# Altium schematic symbol library SCHLIB.SchLib: 2608 symbols (part 7 of 20)
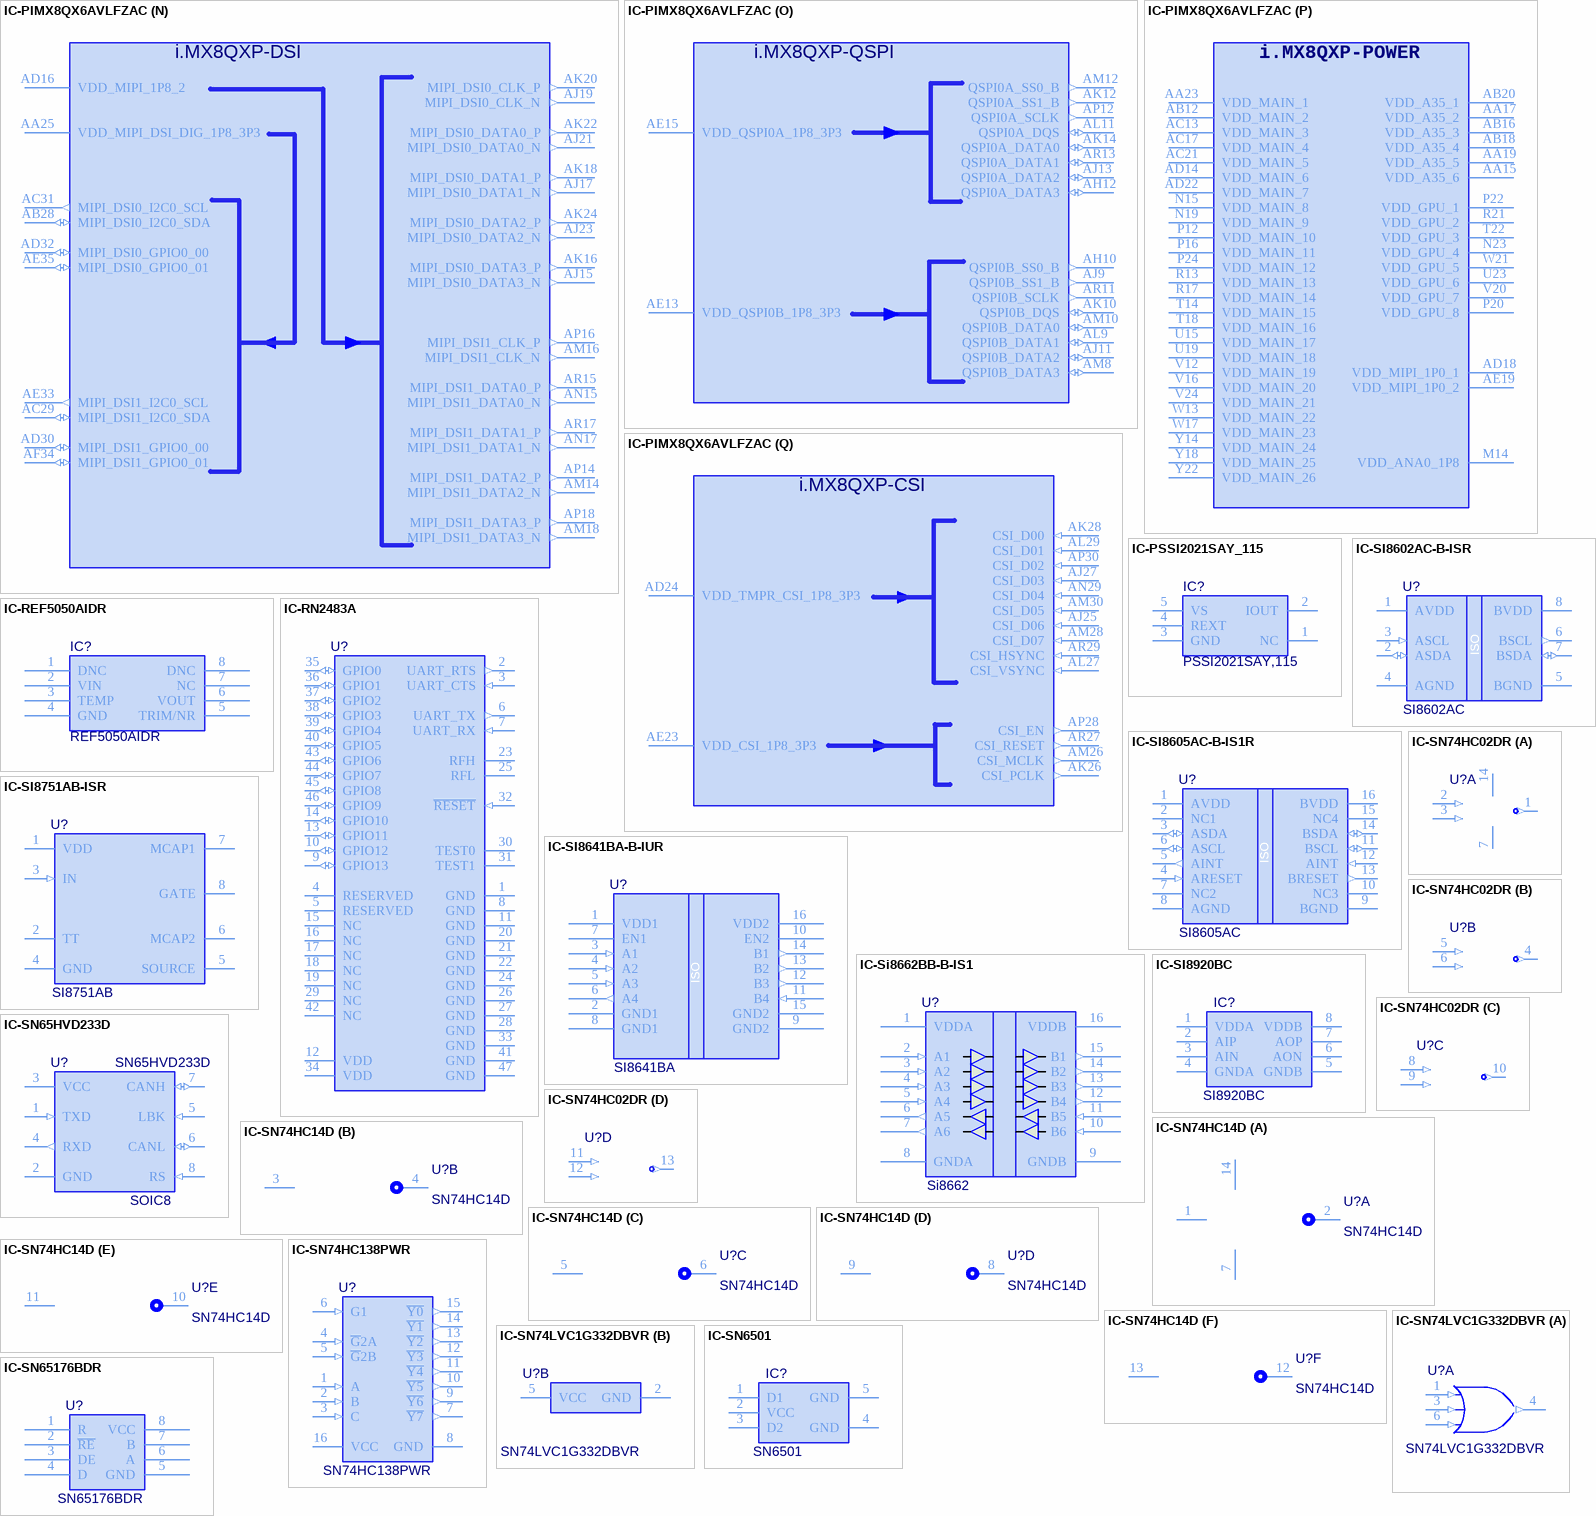
[diagram p89: symbols IC-PIMX8QX6AVLFZAC to IC-SN65176BDR]

## IC-PIMX8QX6AVLFZAC
designator U?, comment PIMX8QX6AVLFZAC  (value not drawn)
IC CPU QUAD CORTEX A35 M4 266MHZ 1.2GHZ 0.3-1.2V FCPBGA609; Manufacturer Part Number: PIMX8QX6AVLFZAC
footprint FBGA609 (0.8 mm pitch, 21 mm x 21 mm x 2.37 mm)
part A pins: A3 VSS_MAIN_1 (power), A17 VSS_MAIN_2 (power), A33 VSS_MAIN_3 (power), AA1 VSS_MAIN_4 (power), AA3 VSS_MAIN_5 (power), AA5 VSS_MAIN_6 (power), AA7 VSS_MAIN_7 (power), AA13 VSS_MAIN_8 (power), AA21 VSS_MAIN_10 (power), AA27 VSS_MAIN_11 (power), AB10 VSS_MAIN_12 (power), AB14 VSS_MAIN_13 (power), AB22 VSS_MAIN_14 (power), AB26 VSS_MAIN_15 (power), AB30 VSS_MAIN_16 (power), AC15 VSS_MAIN_17 (power), AC19 VSS_MAIN_18 (power), AC23 VSS_MAIN_19 (power), AC27 VSS_MAIN_20 (power), AC33 VSS_MAIN_21 (power), AD2 VSS_MAIN_22 (power), AD4 VSS_MAIN_23 (power), AD6 VSS_MAIN_24 (power), AD10 VSS_MAIN_25 (power), AD20 VSS_MAIN_26 (power), AD26 VSS_MAIN_27 (power), AE9 VSS_MAIN_28 (power), AE27 VSS_MAIN_29 (power), AF10 VSS_MAIN_30 (power), AF12 VSS_MAIN_31 (power), AF14 VSS_MAIN_32 (power), AF16 VSS_MAIN_33 (power), AF18 VSS_MAIN_34 (power), AF20 VSS_MAIN_35 (power), AF22 VSS_MAIN_36 (power), AF24 VSS_MAIN_37 (power), AF26 VSS_MAIN_38 (power), AF30 VSS_MAIN_39 (power), AG1 VSS_MAIN_40 (power), AG3 VSS_MAIN_41 (power), AG5 VSS_MAIN_42 (power), AG7 VSS_MAIN_43 (power), AG9 VSS_MAIN_44 (power), AG11 VSS_MAIN_45 (power), AG13 VSS_MAIN_46 (power), AG15 VSS_MAIN_47 (power), AG17 VSS_MAIN_48 (power), AG19 VSS_MAIN_49 (power), AG21 VSS_MAIN_50 (power), AG23 VSS_MAIN_51 (power), AG25 VSS_MAIN_52 (power), AG27 VSS_MAIN_53 (power), AG33 VSS_MAIN_54 (power), AH14 VSS_MAIN_55 (power), AH16 VSS_MAIN_56 (power), AH18 VSS_MAIN_57 (power), AH20 VSS_MAIN_58 (power), AH22 VSS_MAIN_59 (power), AH24 VSS_MAIN_60 (power), AH26 VSS_MAIN_61 (power), AK2 VSS_MAIN_62 (power), AK4 VSS_MAIN_63 (power), AK6 VSS_MAIN_64 (power), AK8 VSS_MAIN_65 (power), AK30 VSS_MAIN_66 (power), AL13 VSS_MAIN_67 (power), AL15 VSS_MAIN_68 (power), AL17 VSS_MAIN_69 (power), AL19 VSS_MAIN_70 (power), AL21 VSS_MAIN_71 (power), AL23 VSS_MAIN_72 (power), AL25 VSS_MAIN_73 (power), AL33 VSS_MAIN_74 (power), AN1 VSS_MAIN_75 (power), AN3 VSS_MAIN_76 (power), AN5 VSS_MAIN_77 (power), AN7 VSS_MAIN_78 (power), AN9 VSS_MAIN_79 (power), AN11 VSS_MAIN_80 (power), AN13 VSS_MAIN_81 (power), AN27 VSS_MAIN_82 (power), AN31 VSS_MAIN_83 (power), AN33 VSS_SCU_XTAL_2 (power), AN35 VSS_SCU_XTAL_3 (power), AR3 VSS_MAIN_100 (power), AR33 VSS_SCU_XTAL_1 (power), B8 VSS_MAIN_101 (power), B14 VSS_MAIN_102 (power), B20 VSS_MAIN_103 (power), C1 VSS_MAIN_104 (power), C3 VSS_MAIN_105 (power), C5 VSS_MAIN_106 (power), C7 VSS_MAIN_107 (power), C9 VSS_MAIN_108 (power), C11 VSS_MAIN_109 (power), C13 VSS_MAIN_110 (power), C17 VSS_MAIN_111 (power), C19 VSS_MAIN_112 (power), C23 VSS_MAIN_113 (power), C27 VSS_MAIN_114 (power), C31 VSS_MAIN_115 (power), C35 VSS_MAIN_116 (power), E15 VSS_MAIN_117 (power), E29 VSS_MAIN_118 (power), E33 VSS_MAIN_119 (power), F2 VSS_MAIN_120 (power), F4 VSS_MAIN_121 (power), F6 VSS_MAIN_122 (power), F8 VSS_MAIN_123 (power), F10 VSS_MAIN_124 (power), F18 VSS_MAIN_125 (power), F20 VSS_MAIN_126 (power), F24 VSS_MAIN_127 (power), H30 VSS_MAIN_128 (power), J1 VSS_MAIN_129 (power), J3 VSS_MAIN_130 (power), J5 VSS_MAIN_131 (power), J7 VSS_MAIN_132 (power), J9 VSS_MAIN_133 (power), J11 VSS_MAIN_134 (power), J13 VSS_MAIN_135 (power), J15 VSS_MAIN_136 (power), J17 VSS_MAIN_137 (power), J19 VSS_MAIN_138 (power), J21 VSS_MAIN_139 (power), J23 VSS_MAIN_140 (power), J25 VSS_MAIN_141 (power), J27 VSS_MAIN_142 (power), J33 VSS_MAIN_143 (power), K10 VSS_MAIN_144 (power), K12 VSS_MAIN_145 (power), K14 VSS_MAIN_146 (power), K16 VSS_MAIN_147 (power), K18 VSS_MAIN_148 (power), K20 VSS_MAIN_149 (power), K22 VSS_MAIN_150 (power), K24 VSS_MAIN_151 (power), K26 VSS_MAIN_152 (power), L9 VSS_MAIN_153 (power), L27 VSS_MAIN_154 (power), M2 VSS_MAIN_155 (power), M4 VSS_MAIN_156 (power), M6 VSS_MAIN_157 (power), M8 VSS_MAIN_158 (power), M10 VSS_MAIN_159 (power), M26 VSS_MAIN_160 (power), M30 VSS_MAIN_161 (power), N13 VSS_MAIN_162 (power), N17 VSS_MAIN_163 (power), N21 VSS_MAIN_164 (power), N27 VSS_MAIN_165 (power), N33 VSS_MAIN_166 (power), P10 VSS_MAIN_167 (power), P14 VSS_MAIN_168 (power), P18 VSS_MAIN_169 (power), P26 VSS_MAIN_170 (power), R1 VSS_MAIN_171 (power), R3 VSS_MAIN_172 (power), R5 VSS_MAIN_173 (power), R9 VSS_MAIN_174 (power), R15 VSS_MAIN_175 (power), R19 VSS_MAIN_176 (power), R23 VSS_MAIN_177 (power), R27 VSS_MAIN_178 (power), T10 VSS_MAIN_179 (power), T16 VSS_MAIN_180 (power), T20 VSS_MAIN_181 (power), T24 VSS_MAIN_182 (power), T26 VSS_MAIN_84 (power), T28 VSS_MAIN_85 (power), T30 VSS_MAIN_86 (power), T32 VSS_MAIN_87 (power), T34 VSS_MAIN_88 (power), U9 VSS_MAIN_89 (power), U13 VSS_MAIN_90 (power), U17 VSS_MAIN_91 (power), U21 VSS_MAIN_92 (power), U27 VSS_MAIN_93 (power), V2 VSS_MAIN_94 (power), V4 VSS_MAIN_95 (power), V6 VSS_MAIN_96 (power), V8 VSS_MAIN_97 (power), V10 VSS_MAIN_98 (power), V14 VSS_MAIN_99 (power), V18 VSS_MAIN_9 (power), V22 VSS_MAIN_198 (power), V26 VSS_MAIN_197 (power), W9 VSS_MAIN_196 (power), W15 VSS_MAIN_195 (power), W19 VSS_MAIN_194 (power), W23 VSS_MAIN_193 (power), W27 VSS_MAIN_192 (power), W31 VSS_MAIN_191 (power), W33 VSS_MAIN_190 (power), W35 VSS_MAIN_189 (power), Y10 VSS_MAIN_188 (power), Y16 VSS_MAIN_187 (power), Y20 VSS_MAIN_186 (power), Y26 VSS_MAIN_185 (power), Y28 VSS_MAIN_184 (power), Y30 VSS_MAIN_183 (power)
part B pins: A5 DDR_DQ31 (io), A7 DDR_DQ28 (io), AA9 VDD_DDR_VDDQ12 (power), AA11 VDD_DDR_VDDQ1 (power), AB2 DDR_DQ14 (io), AB4 DDR_DCF08 (out), AB6 DDR_DCF09 (out), AB8 DDR_ATO (out), AC1 DDR_DQ15 (io), AC3 DDR_DQ12 (io), AC5 DDR_DCF10 (out), AC7 DDR_DTO0 (out), AC9 VDD_DDR_PLL_1P8 (power), AC11 VDD_DDR_VDDQ2 (power), AD8 DDR_VREF (in), AD12 VDD_DDR_VDDQ3 (power), AE1 DDR_DQS1_N (io), AE3 DDR_DQ13 (io), AE5 DDR_DQ01 (io), AE7 DDR_DTO1 (out), AE11 VDD_DDR_VDDQ4 (power), AF2 DDR_DQS1_P (io), AF4 DDR_DM1 (out), AF6 DDR_DQ00 (io), AF8 DDR_DQ03 (io), AH2 DDR_DQ10 (io), AH4 DDR_DQ11 (io), AH6 DDR_DQS0_N (io), AH8 DDR_DQ02 (io), AJ1 DDR_DQ08 (io), AJ3 DDR_DQ09 (io), AJ5 DDR_DQS0_P (io), AJ7 DDR_DM0 (out), AL1 DDR_DQ32 (io), AL3 DDR_DQ34 (io), AL5 DDR_DQ06 (io), AL7 DDR_DQ07 (io), AM2 DDR_DQ33 (io), AM4 DDR_DQ04 (io), AM6 DDR_DQ05 (io), AP2 DDR_DQ35 (io), AP4 DDR_DQS4_P (io), AP6 DDR_DM4 (out), AP8 DDR_DQ36 (io), AP10 DDR_DQ37 (io), AR5 DDR_DQS4_N (io), AR7 DDR_DQ39 (io), AR9 DDR_DQ38 (io), B2 DDR_DQ30 (io), B4 DDR_DQ29 (io), B6 DDR_DQ16 (io), D2 DDR_DQS3_P (io), D4 DDR_DM2 (out), D6 DDR_DQS2_P (io), D8 DDR_DQ19 (io), E1 DDR_DM3 (out), E3 DDR_DQS3_N (io), E5 DDR_DQS2_N (io), E7 DDR_DQ18 (io), E9 DDR_DQ17 (io), G1 DDR_DQ27 (io), G3 DDR_DQ26 (io), G5 DDR_DQ23 (io), G7 DDR_DQ20 (io), G9 DDR_ZQ (in), H2 DDR_DQ24 (io), H4 DDR_DQ25 (io), H6 DDR_DQ22 (io), H8 DDR_DQ21 (io), K2 DDR_DCF29 (out), K4 DDR_DCF27 (out), K6 DDR_DCF28 (out), K8 DDR_DCF25 (out), L1 DDR_DCF18 (out), L3 DDR_DCF32 (out), L5 DDR_DCF31 (out), L7 DDR_DCF26 (out), M12 VDD_DDR_VDDQ5 (power), N1 DDR_DCF19 (out), N3 DDR_DCF17 (out), N5 DDR_CK1_N (out), N7 DDR_DCF30 (out), N9 VDD_DDR_VDDQ13 (power), N11 VDD_DDR_VDDQ6 (power), P2 DDR_DCF22 (out), P4 DDR_DCF20 (out), P6 DDR_CK1_P (out), P8 DDR_DCF33 (out), R7 VDD_DDR_VDDQ14 (power), R11 VDD_DDR_VDDQ7 (power), T2 DDR_DCF07 (out), T4 DDR_DCF23 (out), T6 DDR_DCF24 (out), T8 DDR_DCF21 (out), T12 VDD_DDR_VDDQ8 (power), U1 DDR_DCF03 (out), U3 DDR_DCF01 (out), U5 DDR_DCF05 (out), U7 DDR_DCF04 (out), U11 VDD_DDR_VDDQ9 (power), W1 DDR_DCF00 (out), W3 DDR_DCF11 (out), W5 DDR_CK0_P (out), W7 DDR_DCF16 (out), W11 VDD_DDR_VDDQ10 (power), Y2 DDR_DCF14 (out), Y4 DDR_DCF15 (out), Y6 DDR_CK0_N (out), Y8 DDR_DCF12 (out), Y12 VDD_DDR_VDDQ11 (power)
part C pins: A15 USB_SS3_TX_N (out), A19 USB_SS3_RX_P (in), B16 USB_SS3_TX_P (out), B18 USB_SS3_RX_N (in), C15 USB_SS3_TC3 (io), D14 USB_OTG2_REXT (io), D16 USB_OTG2_DN (io), D18 USB_OTG1_DP (io), E13 USB_SS3_REXT (io), E17 USB_OTG2_DP (io), E19 USB_OTG1_DN (io), F14 USB_SS3_TC0 (io), F16 USB_OTG2_ID (in), G15 USB_SS3_TC2 (io), G17 USB_OTG1_ID (in), H14 USB_SS3_TC1 (io), H16 USB_OTG2_VBUS (power), H18 USB_OTG1_VBUS (power), L15 VDD_USB_3P3 (power), L17 VDD_USB_OTG_1P0 (power), M16 VDD_USB_SS3_LDO_1P0_CAP (power), M18 VDD_USB_1P8 (power)
part D pins: A9 PCIE0_TX0_N (io), A11 PCIE_CTRL0_WAKE_B (in), A13 PCIE0_RX0_P (io), B10 PCIE0_TX0_P (io), B12 PCIE0_RX0_N (io), D10 PCIE_CTRL0_CLKREQ_B (out), D12 PCIE_REFCLK100M_N (io), E11 PCIE_REFCLK100M_P (io), F12 PCIE_REF_QR (out), G11 PCIE0_PHY_PLL_REF_RETURN (in), G13 VDD_PCIE_1P8 (power), H10 PCIE_CTRL0_PERST_B (out), H12 PCIE_REXT (io), L11 VDD_PCIE_DIG_1P8_3P3 (power), L13 VDD_PCIE_LDO_1P0_CAP (power)
part E pins: A25 USDHC1_VSELECT (out), A27 USDHC1_DATA0 (io), B24 USDHC1_RESET_B (out), B26 USDHC1_DATA1 (io), C25 USDHC1_CMD (out), D24 USDHC1_WP (out), D26 USDHC1_DATA2 (io), E23 USDHC1_CD_B (out), E25 USDHC1_DATA3 (io), G23 USDHC1_CLK (out), L21 VDD_USDHC1_VSELECT_1P8_3P3 (power), M22 VDD_USDHC1_1P8_3P3 (power)
part F pins: A21 EMMC0_DATA1 (io), A23 EMMC0_DATA6 (io), B22 EMMC0_DATA4 (io), C21 EMMC0_DATA0 (io), D20 EMMC0_CMD (out), D22 EMMC0_DATA7 (io), E21 EMMC0_DATA2 (io), F22 EMMC0_STROBE (out), G19 EMMC0_CLK (out), G21 EMMC0_DATA5 (io), H20 EMMC0_DATA3 (io), H22 EMMC0_RESET_B (out), L19 VDD_EMMC0_1P8_3P3 (power), M20 VDD_EMMC0_VSELECT_1P8_3P3 (power)
part G pins: A29 ENET0_RGMII_TX_CTL (out), A31 ENET0_RGMII_RXD0 (in), B28 ENET0_RGMII_TXD1 (out), B30 ENET0_RGMII_RX_CTL (out), B32 ENET0_MDIO (io), C29 ENET0_RGMII_RXD1 (in), D28 ENET0_RGMII_RXC (out), D30 ENET0_MDC (out), E27 ENET0_RGMII_TXD2 (out), F26 ENET0_RGMII_TXD3 (out), F28 ENET0_REFCLK_125M_25M (out), G25 ENET0_RGMII_TXD0 (out), G27 ENET0_RGMII_RXD2 (in), H24 ENET0_RGMII_TXC (out), H26 ENET0_RGMII_RXD3 (in), L23 VDD_ENET0_VSELECT_1P8_2P5_3P3 (power), L25 VDD_ENET_MDIO_1P8_3P3 (power), M24 VDD_ENET0_1P8_2P5_3P3 (power)
part H pins: B34 ESAI0_TX1 (out), C33 ESAI0_TX3_RX2 (io), D32 ESAI0_TX0 (out), D34 SPDIF0_TX (out), E31 ESAI0_SCKT (out), E35 SPDIF0_EXT_CLK (out), F30 ESAI0_FSR (in), F32 ESAI0_TX4_RX1 (io), G29 ESAI0_FST (out), G31 SPDIF0_RX (in), H28 ESAI0_SCKR (out), J29 ESAI0_TX5_RX0 (io), K28 ESAI0_TX2_RX3 (io), N25 VDD_ESAI_SPDIF_1P8_2P5_3P3 (power)
part I pins: F34 SPI3_SDO (out), G33 SPI3_SDI (in), G35 MCLK_IN0 (in), H32 SPI3_SCK (out), H34 UART1_TX, J31 SPI3_CS0 (out), J35 SAI0_TXC (out), K30 SPI3_CS1 (out), K32 UART1_CTS_B, K34 SAI0_TXD (out), L29 MCLK_OUT0 (out), L31 UART1_RX, L33 SAI0_TXFS (out), L35 SAI1_RXC (out), M28 MCLK_IN1 (io), M32 SAI1_RXD (in), M34 SAI0_RXD (in), N29 UART1_RTS_B, N31 SPI2_SDI (in), N35 SAI1_RXFS (out), P28 SPI2_CS0 (out), P30 SPI0_SCK (out), P32 SPI2_SDO (out), P34 SPI0_SDI (in), R25 VDD_SPI_MCLK_UART_1P8_3P3 (power), R29 SPI2_SCK (out), R31 SPI0_SDO (out), R33 SPI0_CS0 (out), R35 SPI0_CS1 (out), U25 VDD_SPI_SAI_1P8_3P3 (power)
part J pins: U29 ADC_VREFH (in), U31 ADC_VREFL (in), U33 ADC_IN1 (in), U35 ADC_IN0 (in), V28 VDD_ADC_1P8 (power), V30 ADC_IN3 (in), V32 ADC_IN2 (in), V34 ADC_IN5 (in), W25 VDD_ADC_DIG_1P8 (power), W29 ADC_IN4 (in)
part K pins: AA29 UART0_TX (out), AA31 FLEXCAN2_TX (io), AA33 FLEXCAN1_RX (in), AA35 FLEXCAN1_TX (out), AB32 UART0_RX (in), AB34 FLEXCAN2_RX (io), AC35 UART2_TX (out), AD34 UART2_RX (out), Y24 VDD_CAN_UART_1P8_3P3 (power), Y32 FLEXCAN0_TX (out), Y34 FLEXCAN0_RX (in)
part L pins: AB24 VDD_ANA1_1P8 (power), AC25 VDD_SNVS_4P2 (power), AD28 SCU_WDOG_OUT (io), AE25 VDD_SNVS_LDO_1P8_CAP (power), AE29 TEST_MODE_SELECT (out), AE31 JTAG_TCK (io), AF28 SCU_GPIO0_00 (io), AF32 JTAG_TDO (io), AG29 SCU_PMIC_STANDBY (io), AG31 POR_B (in), AG35 JTAG_TMS (io), AH28 ON_OFF_BUTTON (in), AH30 SCU_GPIO0_01 (io), AH32 PMIC_I2C_SDA (io), AH34 JTAG_TDI (io), AJ29 SCU_BOOT_MODE3 (oc), AJ31 SCU_BOOT_MODE0 (oc), AJ33 PMIC_INT_B (in), AJ35 PMIC_I2C_SCL (out), AK32 SCU_BOOT_MODE1 (oc), AK34 ANA_TEST_OUT_N (io), AL31 SCU_BOOT_MODE2 (oc), AL35 ANA_TEST_OUT_P (io), AM32 RTC_XTALO (out), AM34 XTALO (out), AP32 RTC_XTALI (in), AP34 XTALI (in), AR31 PMIC_ON_REQ (out)
part M pins: AE17 VDD_MIPI_1P8_1 (power), AE21 VDD_MIPI_CSI_DIG_1P8 (power), AM20 MIPI_CSI0_DATA1_N (in), AM22 MIPI_CSI0_DATA0_N (in), AM24 MIPI_CSI0_I2C0_SDA (io), AN19 MIPI_CSI0_DATA3_N (in), AN21 MIPI_CSI0_CLK_N (out), AN23 MIPI_CSI0_DATA2_N (in), AN25 MIPI_CSI0_MCLK_OUT (out), AP20 MIPI_CSI0_DATA1_P (in), AP22 MIPI_CSI0_DATA0_P (in), AP24 MIPI_CSI0_GPIO0_01 (io), AP26 MIPI_CSI0_I2C0_SCL (out), AR19 MIPI_CSI0_DATA3_P (in), AR21 MIPI_CSI0_CLK_P (out), AR23 MIPI_CSI0_DATA2_P (in), AR25 MIPI_CSI0_GPIO0_00 (io)
part N pins: AA25 VDD_MIPI_DSI_DIG_1P8_3P3 (power), AB28 MIPI_DSI0_I2C0_SDA (io), AC29 MIPI_DSI1_I2C0_SDA (io), AC31 MIPI_DSI0_I2C0_SCL (out), AD16 VDD_MIPI_1P8_2 (power), AD30 MIPI_DSI1_GPIO0_00 (io), AD32 MIPI_DSI0_GPIO0_00 (io), AE33 MIPI_DSI1_I2C0_SCL (out), AE35 MIPI_DSI0_GPIO0_01 (io), AF34 MIPI_DSI1_GPIO0_01 (io), AJ15 MIPI_DSI0_DATA3_N (out), AJ17 MIPI_DSI0_DATA1_N (out), AJ19 MIPI_DSI0_CLK_N (out), AJ21 MIPI_DSI0_DATA0_N (out), AJ23 MIPI_DSI0_DATA2_N (out), AK16 MIPI_DSI0_DATA3_P (out), AK18 MIPI_DSI0_DATA1_P (out), AK20 MIPI_DSI0_CLK_P (out), AK22 MIPI_DSI0_DATA0_P (out), AK24 MIPI_DSI0_DATA2_P (out), AM14 MIPI_DSI1_DATA2_N (out), AM16 MIPI_DSI1_CLK_N (out), AM18 MIPI_DSI1_DATA3_N (out), AN15 MIPI_DSI1_DATA0_N (out), AN17 MIPI_DSI1_DATA1_N (out), AP14 MIPI_DSI1_DATA2_P (out), AP16 MIPI_DSI1_CLK_P (out), AP18 MIPI_DSI1_DATA3_P (out), AR15 MIPI_DSI1_DATA0_P (out), AR17 MIPI_DSI1_DATA1_P (out)
part O pins: AE13 VDD_QSPI0B_1P8_3P3 (power), AE15 VDD_QSPI0A_1P8_3P3 (power), AH10 QSPI0B_SS0_B (out), AH12 QSPI0A_DATA3 (io), AJ9 QSPI0B_SS1_B (out), AJ11 QSPI0B_DATA2 (io), AJ13 QSPI0A_DATA2 (io), AK10 QSPI0B_DQS (io), AK12 QSPI0A_SS1_B (out), AK14 QSPI0A_DATA0 (io), AL9 QSPI0B_DATA1 (io), AL11 QSPI0A_DQS (io), AM8 QSPI0B_DATA3 (io), AM10 QSPI0B_DATA0 (io), AM12 QSPI0A_SS0_B (out), AP12 QSPI0A_SCLK (out), AR11 QSPI0B_SCLK (out), AR13 QSPI0A_DATA1 (io)
part P pins: AA15 VDD_A35_6 (power), AA17 VDD_A35_2 (power), AA19 VDD_A35_5 (power), AA23 VDD_MAIN_1 (power), AB12 VDD_MAIN_2 (power), AB16 VDD_A35_3 (power), AB18 VDD_A35_4 (power), AB20 VDD_A35_1 (power), AC13 VDD_MAIN_3 (power), AC17 VDD_MAIN_4 (power), AC21 VDD_MAIN_5 (power), AD14 VDD_MAIN_6 (power), AD18 VDD_MIPI_1P0_1 (power), AD22 VDD_MAIN_7 (power), AE19 VDD_MIPI_1P0_2 (power), M14 VDD_ANA0_1P8 (power), N15 VDD_MAIN_8 (power), N19 VDD_MAIN_9 (power), N23 VDD_GPU_4 (power), P12 VDD_MAIN_10 (power), P16 VDD_MAIN_11 (power), P20 VDD_GPU_8 (power), P22 VDD_GPU_1 (power), P24 VDD_MAIN_12 (power), R13 VDD_MAIN_13 (power), R17 VDD_MAIN_14 (power), R21 VDD_GPU_2 (power), T14 VDD_MAIN_15 (power), T18 VDD_MAIN_16 (power), T22 VDD_GPU_3 (power), U15 VDD_MAIN_17 (power), U19 VDD_MAIN_18 (power), U23 VDD_GPU_6 (power), V12 VDD_MAIN_19 (power), V16 VDD_MAIN_20 (power), V20 VDD_GPU_7 (power), V24 VDD_MAIN_21 (power), W13 VDD_MAIN_22 (power), W17 VDD_MAIN_23 (power), W21 VDD_GPU_5 (power), Y14 VDD_MAIN_24 (power), Y18 VDD_MAIN_25 (power), Y22 VDD_MAIN_26 (power)
part Q pins: AD24 VDD_TMPR_CSI_1P8_3P3 (power), AE23 VDD_CSI_1P8_3P3 (power), AJ25 CSI_D06 (in), AJ27 CSI_D03 (in), AK26 CSI_PCLK (out), AK28 CSI_D00 (in), AL27 CSI_VSYNC (in), AL29 CSI_D01 (in), AM26 CSI_MCLK (out), AM28 CSI_D07 (in), AM30 CSI_D05 (in), AN29 CSI_D04 (in), AP28 CSI_EN (out), AP30 CSI_D02 (in), AR27 CSI_RESET (out), AR29 CSI_HSYNC (in)
part A text: PWR_GND
part B text: i.MX8QXP-DDR; DCF    LPDDR4               DDR3; 00 / 01 / 03 / 04 / 05 / 07 / 08 / 09 / 10 / 11 / 12 / 14 / 15 / 16 / 17 / 18 / 19 / 20 / 21 / 22 / 23 / 24 / 25 / 26 / 27 / 28 / 29 / 30 / 31 / 32 / 33; CA2_A / CA4_A / CA5_A / - / - / - / CA3_A / ODT_CA_A / CS0_A / CA0_A / CS1_A / CKE0_A / CKE1_A / CA1_A / CA4_B / RESET_N / CA5_B / - / - / - / - / - / ODT_CA_B / CA3_B / CA0_B / CS0_B / CS1_B / CKE0_B / CKE1_B / CA1_B / CA2_B; A5 / A6 / A7 / A8 / A9 / RAS# / A3 / ODT / A1 / A0 / A2 / - / - / A4 / A12 / RESET_N / A14 / A15 / BA0 / BA1 / BA2 / CAS# / ODT1 / A13 / A10 / CS_N[0] / CS_N[1] / CKE0 / CKE1 / A11 / WE #
part C text: i.MX8QXP-USB
part D text: i.MX8QXP-PCIE
part E text: i.MX8QXP-SD
part F text: i.MX8QXP-EMMC
part G text: i.MX8QXP-ENET
part H text: i.MX8QXP-ESAI&SPDIF
part I text: i.MX8QXP-SAI&SPI
part J text: i.MX8QXP-ADC
part K text: i.MX8QXP-CAN&UART
part L text: i.MX8QXP-SYSTEM; LDO
part M text: i.MX8QXP-MIPI_CSI
part N text: i.MX8QXP-DSI
part O text: i.MX8QXP-QSPI
part P text: i.MX8QXP-POWER
part Q text: i.MX8QXP-CSI

## IC-PSSI2021SAY_115
designator IC?, comment PSSI2021SAY,115
Current Source Regulator  50mA 5-TSSOP; Manufacturer: Nexperia; Supplier 1: Avnet; Manufacturer Part Number: PSSI2021SAY,115; Stock 1: 138000; Pricing 1: 3000=0.10569, 6000=0.10559, 12000=0.09665, 18000=0.09653, 24000=0.09348 (USD); RoHS: No; ComponentLink1URL: http://www.farnell.com/datasheets/667515.pdf?src-supplier=Farnell; ComponentLink1Description: http://www.farnell.com/datasheets/667515.pdf?src-supplier=Farnell; ComponentLink2URL: https://assets.nexperia.com/documents/data-sheet/PSSI2021SAY.pdf?src-supplier=Digi-Key; ComponentLink2Description: https://assets.nexperia.com/documents/data-sheet/PSSI2021SAY.pdf?src-supplier=Digi-Key; ComponentLink3URL: http://www.farnell.com/datasheets/667515.pdf?src-supplier=Newark; ComponentLink3Description: http://www.farnell.com/datasheets/667515.pdf?src-supplier=Newark; Supplier Part Number 1: PSSI2021SAY,115
footprint SOT353 (SOT23, 5-Leads, Body 2.00x2.10mm, Pitch 0.65mm, IPC Medium Density)
pins: 1 NC, 2 IOUT, 3 GND, 4 REXT, 5 VS

## IC-REF5050AIDR
designator IC?, comment REF5050AIDR
TEXAS INSTRUMENTS - REF5050AIDR - VOLTAGE REF, SERIES, 5V, SOIC-8; Min Input Voltage: 5.2V; Max Input Voltage: 18V; Tolerance: 0.1%; Number of Channels: 1; Nominal Supply Current: 800uA; Max Output Current: 10mA; Temperature Coefficient: 3ppm/°C; Quiescent Current: 1mA; Operating Supply Current: 1.2mA; Output Type: Fixed; Supplier 1: Mouser; Manufacturer: Texas Instruments; Manufacturer Part Number: REF5050AIDR; Stock 1: 7058; Pricing 1: 1=2,92000, 10=2,62000, 25=2,48000, 100=2,04000, 250=1,83000, 500=1,76000 (USD); RoHS: Yes; Case/Package: D; Number of Pins: 8; Weight: 0.002677oz; Min Operating Temperature: -40°C; Max Operating Temperature: 125°C; Packaging: Tape and Reel; Output Voltage: 5V; Package Quantity: 2500; Output Current: 10mA; Reference Voltage: 5V; Reference Type: Series; Min Output Voltage: 5V; Radiation Hardening: No; REACH SVHC: No SVHC; Lead Free: Lead Free; ComponentLink1URL: https://datasheet.ciiva.com/4065/43001021s8324725n7713-4065643.pdf?src-supplier=Arrow; ComponentLink1Description: https://datasheet.ciiva.com/4065/43001021s8324725n7713-4065643.pdf?src-supplier=Arrow; ComponentLink2URL: https://datasheet.ciiva.com/2012/ref5020-2012761.pdf?src-supplier=Digi-Key; ComponentLink2Description: https://datasheet.ciiva.com/2012/ref5020-2012761.pdf?src-supplier=Digi-Key; ComponentLink3URL: https://datasheet.ciiva.com/3236/ref5050-3236312.pdf?src-supplier=Avnet; ComponentLink3Description: https://datasheet.ciiva.com/3236/ref5050-3236312.pdf?src-supplier=Avnet; Supplier Part Number 1: 595-REF5050AIDR
pins: 1 DNC, 2 VIN, 3 TEMP, 4 GND, 5 TRIM/NR, 6 VOUT, 7 NC, 8 DNC

## IC-RN2483A
designator U?, comment RN2483A-I/RM103  (value not drawn)
MODULE LORA LONG RANGE; Manufacturer: Microchip; Interface: I2C,SPI,UART; Frequency: 868MHz; Data Rate: 300Kbps; Sensitivity: -146dBm; Current - Receiving: 14mA; Current - Transmitting: 39mA; Washability: OK; Datasheet URL: http://www.microchip.com/mymicrochip/filehandler.aspx?ddocname=en574289; Package Description: 47-Pin Surface Mount Device, Body 26.67 x 17.78 mm, Pitch 1.27 mm; Package Reference: MODULE-47; RoHSCompliant: false; Mounting Technology: SurfaceMount; Datasheet Version: Rev. C, 04/2017; Manufacturer URL: http://www.microchip.com/; Supplier 1: Digi-Key; Supplier Part Number 1: RN2483A-I/RM103-ND; Manufacturer Part Number: RN2483A-I/RM103; Stock 1: 0; Pricing 1: 1=13.18000, 25=12.05120 (USD); RoHS: No; Mount: Surface Mount; Case/Package: Module; Min Operating Temperature: -40°C; Max Operating Temperature: 85°C; Packaging: Tray; ComponentLink1URL: http://www.farnell.com/datasheets/2140371.pdf?src-supplier=Farnell; ComponentLink1Description: http://www.farnell.com/datasheets/2140371.pdf?src-supplier=Farnell; ComponentLink2URL: http://www.microchip.com/mymicrochip/filehandler.aspx?ddocname=en584959&src-supplier=Digi-Key; ComponentLink2Description: http://www.microchip.com/mymicrochip/filehandler.aspx?ddocname=en584959&src-supplier=Digi-Key
footprint MCHP-MODULE-47_V (SMD, 47-Leads, Body 26.67x17.78mm, Pitch 1.27mm)
pins: 1 GND (power) "Ground supply terminal", 2 UART_RTS (out) "Communication UART RTS signal, or GPIO", 3 UART_CTS (in) "Communication UART CTS signal, or GPIO", 4 RESERVED "Do not connect", 5 RESERVED "Do not connect", 6 UART_TX (out) "Communication UART Transmit (TX)", 7 UART_RX (in) "Communication UART Receive (RX)", 8 GND (power) "Ground supply terminal", 9 GPIO13 (io) "General purpose I/O pin or analog input", 10 GPIO12 (io) "General purpose I/O pin or analog input", 11 GND (power) "Ground supply terminal", 12 VDD (power) "Positive supply terminal", 13 GPIO11 (io) "General purpose I/O pin or analog input", 14 GPIO10 (io) "General purpose I/O pin or analog input", 15 NC "Not connected", 16 NC "Not connected", 17 NC "Not connected", 18 NC "Not connected", 19 NC "Not connected", 20 GND (power) "Ground supply terminal", 21 GND (power) "Ground supply terminal", 22 GND (power) "Ground supply terminal", 23 RFH "RF signal pin for high band", 24 GND (power) "Ground supply terminal", 25 RFL "RF signal pin for low band", 26 GND (power) "Ground supply terminal", 27 GND (power) "Ground supply terminal", 28 GND (power) "Ground supply terminal", 29 NC "Not connected", 30 TEST0, 31 TEST1, 32 ~{RESET} (in) "Active-low device Reset input", 33 GND (power) "Ground supply terminal", 34 VDD (power) "Positive supply terminal", 35 GPIO0 (io) "General purpose I/O pin or analog input", 36 GPIO1 (io) "General purpose I/O pin or analog input", 37 GPIO2 (io) "General purpose I/O pin or analog input", 38 GPIO3 (io) "General purpose I/O pin or analog input", 39 GPIO4 (io) "General purpose I/O pin", 40 GPIO5 (io) "General purpose I/O pin or analog input", 41 GND (power) "Ground supply terminal", 42 NC "Not connected", 43 GPIO6 (io) "General purpose I/O pin or analog input", 44 GPIO7 (io) "General purpose I/O pin or analog input", 45 GPIO8 (io) "General purpose I/O pin or analog input", 46 GPIO9 (io) "General purpose I/O pin or analog input", 47 GND (power) "Ground supply terminal"